# Altium footprint library HedefPro_Library.PcbLib: 35 footprints (part 1 of 3)
Each footprint in its own frame and in the unit in brackets; x right, y up, seen from the top. Pads: shape width x height; smd on the part's side, far side on the other; paste and mask are expansions set on the pad; w line width, h text height; cw(c..) or ccw(c..) is an arc to the next point about the centre after c.
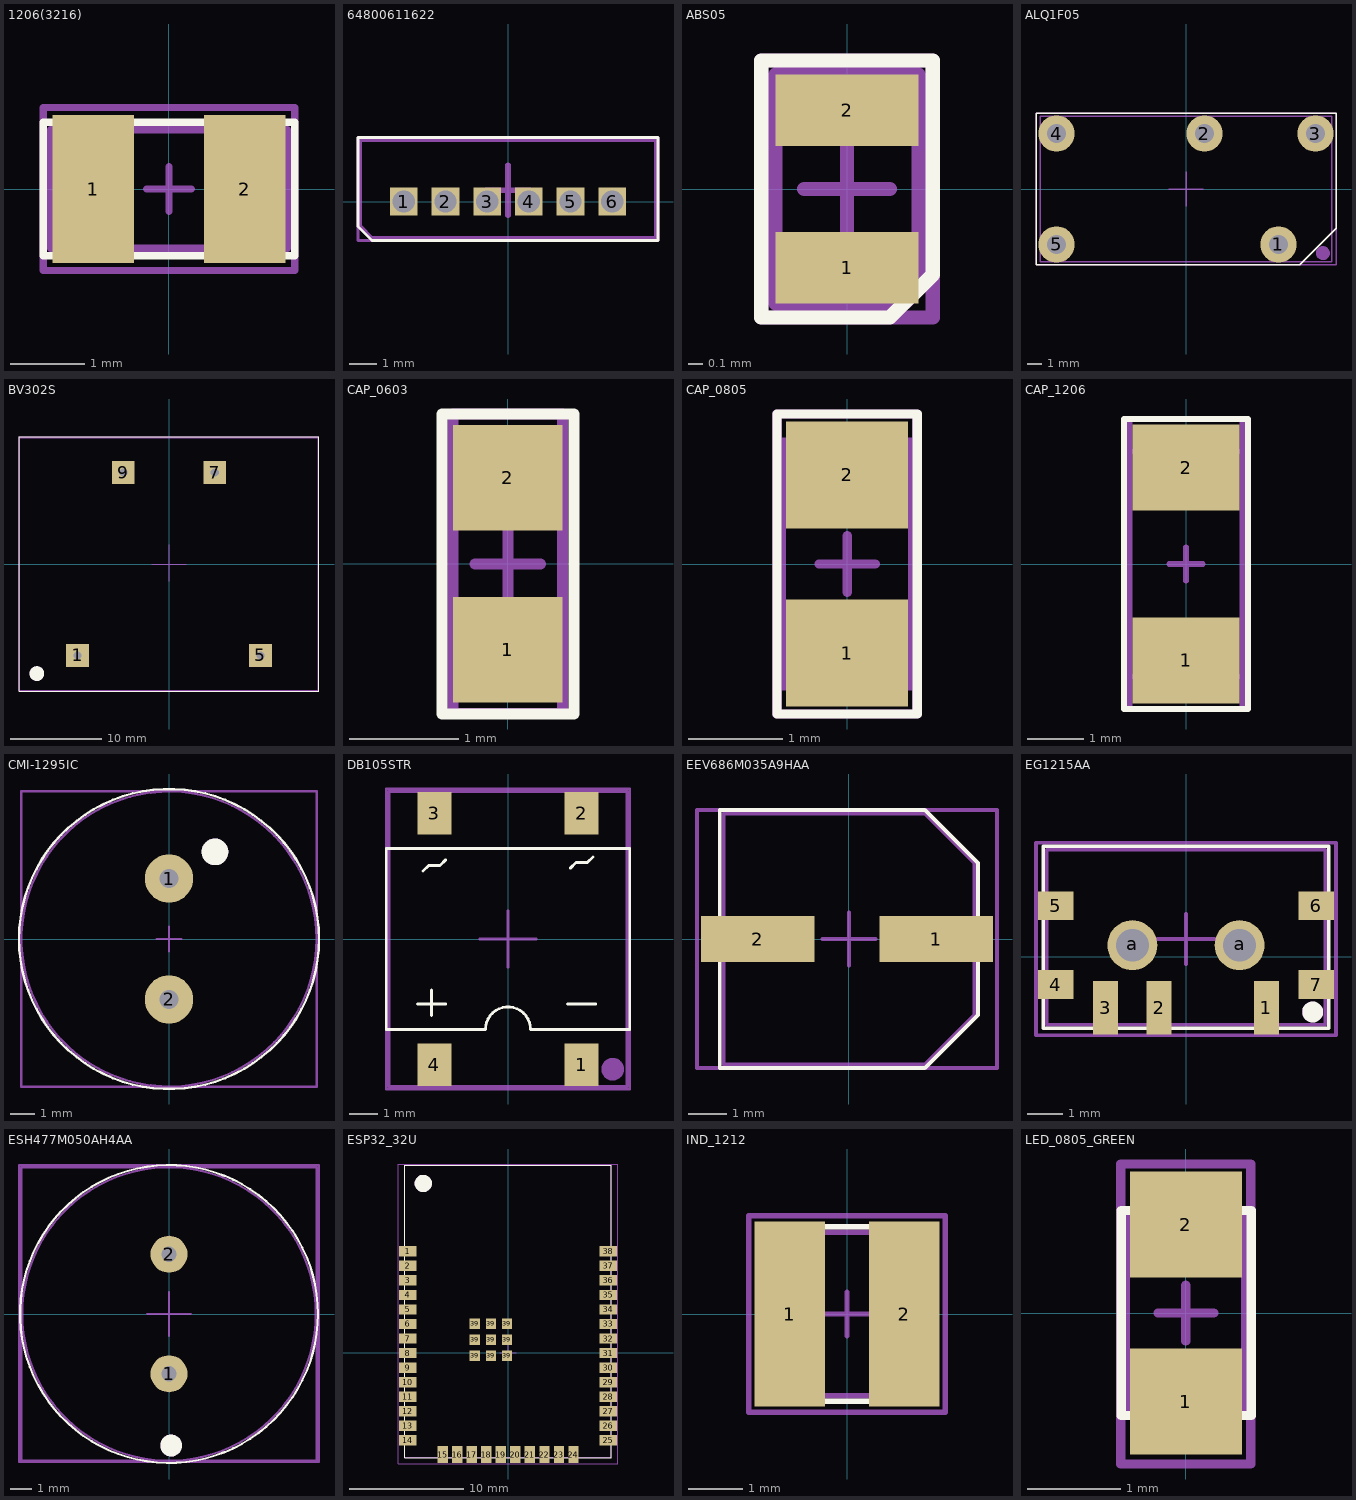
[diagram p0: the footprints below, top view; thin cyan lines are the x and y axes]

## 1206(3216) [mm]
pads (2):
  rect 1.1x2 smd mask+0.05: 1(-1.025,0) 2(1.025,0)
Top Overlay:
  lines w0.1: -1.7,-0.9 1.7,-0.9 1.7,0.9 -1.7,0.9 -1.7,-0.9
Top 3D Body:
  lines w0.1: -1.6,-0.8 -1.6,0.8 1.6,0.8 1.6,-0.8 -1.6,-0.8
Top Component Center:
  lines w0.1: -0.3,0 0.3,0 ; 0,-0.3 0,0.3 ; -1.7,-1.1 -1.7,1.1 1.7,1.1 1.7,-1.1 -1.7,-1.1
Top Designator:
  lines w0.1: -1.7,-1.1 -1.7,1.1 1.7,1.1 1.7,-1.1 -1.7,-1.1
  text ".Designator" at -1,-0.133 h0.5
3D body "1206(3216).x_t": height 0.56, standoff 0, extent -1.55,-0.775 1.55,0.775

## 64800611622 [mm]
pads (6):
  rect 1x1 hole 0.8 mask+0.05: 1(-3.75,0) 2(-2.25,0) 3(-0.75,0) 4(0.75,0) 5(2.25,0) 6(3.75,0)
Top Overlay:
  lines w0.1: -5.4,-0.9 -4.9,-1.4 5.4,-1.4 5.4,2.3 -5.4,2.3 -5.4,-0.9
Top 3D Body:
  lines w0.1: -5.3,-0.893 -4.893,-1.3 5.3,-1.3 5.3,2.2 -5.3,2.2 -5.3,-0.893
Top Component Center:
  lines w0.1: -5.4,-1.4 5.4,-1.4 5.4,2.3 -5.4,2.3 -5.4,-1.4
  lines w0.2: -0.8,0.4 0,0.4 0.8,0.4 ; 0,-0.5 0,1.3 ; 0.8,0.4 0.8,0.4
Top Designator:
  lines w0.1: -5.4,-1.4 5.4,-1.4 5.4,2.3 -5.4,2.3 -5.4,-1.4
  text ".Designator" at -3.846,-0.138 h1.52
3D body "64800611622 (rev1).stp": height 4.75, standoff -2.45, extent -5.25,-1.3 5.25,2.2

## ABS05 [mm]
pads (2):
  rect 1x0.5 smd mask+0.05: 1(0,-0.55) 2(0,0.55)
Top Overlay:
  lines w0.1: -0.6,-0.9 -0.6,0.9 0.6,0.9 0.6,-0.6 0.3,-0.9 -0.6,-0.9
Top 3D Body:
  lines w0.1: -0.5,-0.8 -0.5,0.8 0.5,0.8 0.5,-0.7 0.4,-0.8 -0.5,-0.8
Top Component Center:
  lines w0.1: -0.3,0 0.3,0 ; 0,-0.3 0,0.3 ; -0.6,-0.9 0.6,-0.9 0.6,0.9 -0.6,0.9 -0.6,-0.9
Top Designator:
  lines w0.1: -0.6,-0.9 0.6,-0.9 0.6,0.9 -0.6,0.9 -0.6,-0.9
  text ".Designator" at 0.167,-0.4 h0.4
3D body "ABS05--3DModel-STEP-400430.STEP": height 0.5, standoff 0, extent -0.5,-0.8 0.5,0.8

## ALQ1F05 [mm]
pads (5):
  round 2.5 hole 1.3 mask+0.05: 1(6.35,-3.81) 2(1.27,3.81) 3(8.89,3.81) 4(-8.89,3.81) 5(-8.89,-3.81)
Top Overlay:
  lines w0.1: -10.3,-5.2 7.8,-5.2 10.3,-2.7 10.3,5.2 -10.3,5.2 -10.3,-5.2
Top 3D Body:
  circle w0.5: c9.4,-4.4 r0.23
  lines w0.1: -10,-5 -10,5 ; -10,-5 10,-5 ; -10,-5 -10,5 ; -10,-5 10,-5 ; -10,5 10,5 ; -10,5 10,5 ; 10,-5 10,5 ; 10,-5 10,5
Top Component Center:
  lines w0.1: -1.2,0 1.2,0 ; 0,-1.2 0,1.2 ; -10.3,-5.2 -10.3,5.2 10.3,5.2 10.3,-5.2 -10.3,-5.2
Top Designator:
  lines w0.1: -10.3,-5.2 -10.3,5.2 10.3,5.2 10.3,-5.2 -10.3,-5.2
  text ".Designator" at -4.9,-0.534 h2
3D body: height 0.1, standoff -4.1, extent -9.29,-4.21 -8.49,-3.41
3D body: height 0.1, standoff -4.1, extent -9.29,3.41 -8.49,4.21
3D body: height 0.1, standoff -4.1, extent 0.87,3.41 1.67,4.21
3D body: height 0.1, standoff -4.1, extent 8.49,3.41 9.29,4.21
3D body: height 0.1, standoff -4.1, extent 5.95,-4.21 6.75,-3.41
3D body: height 12.6, standoff 0.1, extent -10,-5 10,5
3D body: height 15.7, standoff 12.6, extent -10,-5 10,5

## BV302S [mm]
pads (4):
  rect 2.5x2.5 hole 0.9 mask+0.05: 1(-10,-10) 5(10,-10) 7(5,10) 9(-5,10)
Top Overlay:
  circle w0.8: c-14.446,-11.977 r0.4
  lines w0.1: -16.4,-13.9 -16.4,13.9 16.4,13.9 16.4,-13.9 -16.4,-13.9
Top 3D Body:
  circle w0.8: c-14.449,-11.981 r0.4
  lines w0.1: -16.3,-13.8 -16.3,13.8 16.3,13.8 16.3,-13.8 -16.3,-13.8
Top Component Center:
  lines w0.1: -1.9,0 1.9,0 ; 0,-1.9 0,2.1 ; -16.4,-13.9 -16.4,13.9 16.4,13.9 16.4,-13.9 -16.4,-13.9
Top Designator:
  lines w0.1: -16.4,-13.9 -16.4,13.9 16.4,13.9 16.4,-13.9 -16.4,-13.9
  text ".Designator" at -7.546,-0.038 h1.52
3D body "BV EI 302 2902.step": height 22.2, standoff -4.1, extent -16.25,-13.75 16.25,13.75

## CAP_0603 [mm]
pads (2):
  rect 1x0.965 smd mask+0.05: 1(0,-0.787) 2(0,0.788)
Top Overlay:
  lines w0.1: -0.602,-1.373 0.605,-1.373 0.605,1.367 -0.602,1.367 -0.602,-1.373
Top 3D Body:
  lines w0.1: -0.5,-1.04 -0.5,1.051 0.5,1.051 0.5,-1.04 -0.5,-1.04
Top Component Center:
  lines w0.1: -0.3,0 0.3,0 ; 0,-0.3 0,0.3 ; -0.5,-1.37 0.5,-1.37 0.5,1.369 -0.5,1.369 -0.5,-1.37
Top Designator:
  lines w0.1: -0.5,-1.37 0.5,-1.37 0.5,1.369 -0.5,1.369 -0.5,-1.37
  text ".Designator" at 0.05,-1.05 h0.3
3D body "CAPC0603.STEP": height 0.85, standoff 0.05, extent -0.507,-1.047 0.522,1.053

## CAP_0805 [mm]
pads (2):
  rect 1.3x1.14 smd mask+0.05: 1(0,-0.95) 2(0,0.95)
Top Overlay:
  lines w0.1: -0.749,-1.6 -0.749,1.6 0.749,1.6 0.749,-1.6 -0.749,-1.6
Top 3D Body:
  lines w0.1: -0.7,-1.3 0.7,-1.3 0.7,1.3 -0.7,1.3 -0.7,-1.3
Top Component Center:
  lines w0.1: -0.3,0 0.3,0 ; 0,-0.3 0,0.3 ; -0.745,-1.6 -0.745,1.6 0.742,1.6 0.742,-1.6 -0.745,-1.6
Top Designator:
  lines w0.1: -0.754,-1.6 0.751,-1.6 0.751,1.6 -0.754,1.6 -0.754,-1.6
  text ".Designator" at 0.134,-0.8 h0.5
3D body "CAPC0805.STEP": height 1, standoff 0.1, extent -0.678,-1.301 0.678,1.301

## CAP_1206 [mm]
pads (2):
  rect 1.9x1.52 smd mask+0.05: 1(0,-1.71) 2(0,1.71)
Top Overlay:
  lines w0.1: -1.1,-2.571 -1.1,2.571 1.1,2.571 1.1,-2.571 -1.1,-2.571
Top 3D Body:
  lines w0.1: -1,-2 -1,2 1,2 1,-2 -1,-2
Top Component Center:
  lines w0.1: -0.3,0 0.3,0 ; 0,-0.3 0,0.3 ; -1,-2.57 -1,2.569 1,2.569 1,-2.57 -1,-2.57
Top Designator:
  lines w0.1: -1,-2.569 -1,2.568 1,2.568 1,-2.569 -1,-2.569
  text ".Designator" at 0.25,-0.65 h0.6
3D body "CAPC1206.STEP": height 1.4, standoff 0.09, extent -0.976,-1.975 0.976,1.975

## CMI-1295IC [mm]
pads (2):
  round 2 hole 0.8 mask+0.05: 1(0,2.5) 2(0,-2.5)
Top Overlay:
  circle w0.6: c1.9,3.6 r0.25
  circle w0.1: c0,0 r6.2
Top 3D Body:
  circle w0.6: c1.9,3.6 r0.25
  lines w0.1: -6.1,-6.1 -6.1,6.1 6.1,6.1 6.1,-6.1 -6.1,-6.1
Top Component Center:
  circle w0.1: c0,0 r6.1
  lines w0.1: -0.5,0 0.5,0 ; 0,-0.5 0,0.5
Top Designator:
  circle w0.1: c0,0 r6.1
  text ".Designator" at -3.346,-0.638 h1.52
3D body: height 9.8, standoff 0.1, extent -6.1,-6.1 6.1,6.1
3D body: height 0.1, standoff -3.9, extent -0.32,-2.82 0.32,-2.18
3D body: height 0.1, standoff -5.4, extent -0.32,2.18 0.32,2.82

## DB105STR [mm]
pads (4):
  rect 1.2x1.5 smd mask+0.05: 1(2.6,-4.45) 2(2.6,4.45) 3(-2.6,4.45) 4(-2.6,-4.45)
Top Overlay:
  lines w0.1: -3.2,-2.3 -2.2,-2.3 ; -3,2.4 -2.8,2.6 -2.4,2.6 -2.2,2.8 ; -2.7,-2.7 -2.7,-1.8 ; 2.1,-2.3 3.1,-2.3 ; 2.2,2.5 2.4,2.7 2.8,2.7 3,2.9 ; -4.3,-3.2 -0.8,-3.2 cw(c0,-3.2) 0.8,-3.2 4.3,-3.2 4.3,3.2 -4.3,3.2 -4.3,-3.2
Top 3D Body:
  circle w0.4: c3.7,-4.6 r0.2
  lines w0.1: -4.2,-5.2 4.2,-5.2 ; -4.2,-5.2 4.2,-5.2 ; -4.2,-5.2 4.2,-5.2 ; -4.2,-5.2 -4.2,5.2 ; -4.2,-5.2 -4.2,5.2 ; -4.2,-5.2 -4.2,5.2 ; -4.2,5.2 4.2,5.2 ; -4.2,5.2 4.2,5.2 ; -4.2,5.2 4.2,5.2 ; 4.2,-5.2 4.2,5.2 ; 4.2,-5.2 4.2,5.2 ; 4.2,-5.2 4.2,5.2
Top Component Center:
  lines w0.1: -1,0 1,0 ; 0,-1 0,1 ; -4.3,-5.3 -4.3,5.3 4.3,5.3 4.3,-5.3 -4.3,-5.3
Top Designator:
  lines w0.1: -4.3,-5.3 -4.3,5.3 4.3,5.3 4.3,-5.3 -4.3,-5.3
  text ".Designator" at -3.1,-0.6 h1.2
3D body "User Library-DB107S  DB-S.step": height 2.76, standoff 0.1, extent -4.16,-5.2 4.16,5.2

## EEV686M035A9HAA [mm]
pads (2):
  rect 3x1.2 smd mask+0.05: 1(2.3,0) 2(-2.4,0)
Top Overlay:
  rectangle: -3.4,-0.6 -2.8,0.6
  lines w0.1: -3.4,-3.4 2,-3.4 3.4,-2 3.4,2 2,3.4 -3.4,3.4 -3.4,-3.4
Top 3D Body:
  rectangle: -3.3,-0.6 -2.7,0.6
  lines w0.1: -3.3,-3.3 2,-3.3 3.3,-2 3.3,2 2,3.3 -3.3,3.3 -3.3,-3.3
Top Component Center:
  lines w0.1: -0.7,0 0.7,0 ; 0,-0.7 0,0.7 ; -4,-3.4 3.9,-3.4 3.9,3.4 -4,3.4 -4,-3.4
Top Designator:
  lines w0.1: -4,-3.4 3.9,-3.4 3.9,3.4 -4,3.4 -4,-3.4
  text ".Designator" at -2.046,-1.138 h1.52
3D body: height 1.2, standoff 0.2, extent -3.3,-3.309 3.3,3.3
3D body: height 0.4, standoff 0.1, extent 0.9,-0.325 3.5,0.325
3D body: height 0.4, standoff 0.1, extent -3.5,-0.325 -0.9,0.325
3D body: height 8.9, standoff 1.2, extent -3.2,-3.2 3.2,3.2

## EG1215AA [mm]
pads (9):
  rect 0.7x1.5 smd mask+0.05: 1(2.25,-1.425) 2(-0.75,-1.425) 3(-2.25,-1.425)
  rect 1x0.8 smd mask+0.05: 4(-3.65,-0.775) 5(-3.65,1.425) 6(3.65,1.425) 7(3.65,-0.775)
  round 1.4 hole 0.92 mask+0.05: a(-1.5,0.325) a(1.5,0.325)
Top Overlay:
  circle w0.3: c3.547,-1.543 r0.141
  lines w0.1: -4,-2 -4,3.1 4,3.1 4,-2 -4,-2
Top 3D Body:
  circle w0.3: c3.542,-1.543 r0.141
  lines w0.1: -3.9,-1.9 -3.9,3 3.9,3 3.9,-1.9 -3.9,-1.9
Top Component Center:
  lines w0.1: -0.8,0.5 0.8,0.5 ; 0,-0.2 0,1.2 ; -4.2,-2.2 -4.2,3.2 4.2,3.2 4.2,-2.2 -4.2,-2.2
Top Designator:
  lines w0.1: -4.2,-2.2 -4.2,3.2 4.2,3.2 4.2,-2.2 -4.2,-2.2
  text ".Designator" at -2.246,-0.038 h1.52
3D body "EG1215AA--3DModel-STEP-1.STEP": height 1.4, standoff -0.3, extent -3.85,-1.875 3.85,3.025

## ESH477M050AH4AA [mm]
pads (2):
  round 1.7 hole 0.7 mask+0.05: 1(0,-2.75) 2(0,2.75)
Top Overlay:
  circle w0.5: c0.1,-6.05 r0.25
  circle w0.1: c0,0 r6.85
Top 3D Body:
  circle w0.5: c0.1,-6.05 r0.25
  lines w0.1: -6.8,-6.75 -6.8,6.75 6.8,6.75 6.8,-6.75 -6.8,-6.75
Top Component Center:
  lines w0.1: -1,0 1,0 ; 0,-1 0,1 ; -6.9,-6.8 6.9,-6.8 6.9,6.848 -6.9,6.848 -6.9,-6.8
Top Designator:
  circle w0.1: c0,0 r6.75
  text ".Designator" at -4.446,-0.438 h1.52
3D body "esh477m050al3aa.stp": height 22.11, standoff -19.9, extent -6.75,-6.75 6.75,6.75

## ESP32_32U [mm]
pads (47):
  rect 1.5x0.9 smd mask+0.05: 1(-8.75,8.877) 2(-8.75,7.607) 3(-8.75,6.337) 4(-8.75,5.067) 5(-8.75,3.797) 6(-8.75,2.527) 7(-8.75,1.257) 8(-8.75,-0.013) 9(-8.75,-1.283) 10(-8.75,-2.553) 11(-8.75,-3.823) 12(-8.75,-5.093) 13(-8.75,-6.363) 14(-8.75,-7.633) 25(8.75,-7.633) 26(8.75,-6.363) 27(8.75,-5.093) 28(8.75,-3.823) 29(8.75,-2.553) 30(8.75,-1.283) 31(8.75,-0.013) 32(8.75,1.257) 33(8.75,2.527) 34(8.75,3.797) 35(8.75,5.067) 36(8.75,6.337) 37(8.75,7.607) 38(8.75,8.877)
  rect 0.9x1.5 smd mask+0.05: 15(-5.71,-8.877) 16(-4.44,-8.877) 17(-3.17,-8.877) 18(-1.9,-8.877) 19(-0.63,-8.877) 20(0.64,-8.877) 21(1.91,-8.877) 22(3.18,-8.877) 23(4.45,-8.877) 24(5.72,-8.877)
  rect 0.9x0.9 smd mask+0.05: 39(-2.893,-0.24) 39(-2.893,1.16) 39(-2.893,2.56) 39(-1.493,-0.24) 39(-1.493,1.16) 39(-1.493,2.56) 39(-0.093,-0.24) 39(-0.093,1.16) 39(-0.093,2.56)
Top Overlay:
  circle w0.9: c-7.4,14.8 r0.3
  lines w0.1: -9,-9.133 -9,16.4 9,16.4 9,-9.133 -9,-9.133
Top 3D Body:
  circle w0.9: c-7.4,14.8 r0.3
  lines w0.1: -9,-9.1 9,-9.1 9,16.4 -9,16.4 -9,-9.1
Top Component Center:
  lines w0.1: -0.7,0 0.7,0 ; 0,-0.7 0,0.7 ; -9.6,-9.7 -9.6,16.5 9.6,16.5 9.6,-9.7 -9.6,-9.7
Top Designator:
  lines w0.1: -9.6,-9.7 9.6,-9.7 9.6,16.5 -9.6,16.5 -9.6,-9.7
  text ".Designator" at -6,0.033 h2.5
3D body "ESP32 v8.stp": height 2.85, standoff 0.1, extent -9,-9.132 9,16.368

## IND_1212 [mm]
pads (2):
  rect 1.3x3.4 smd mask+0.05: 1(-1.05,0) 2(1.05,0)
Top Overlay:
  lines w0.1: -1.6,-1.6 -1.6,1.6 1.6,1.6 1.6,-1.6 -1.6,-1.6
Top 3D Body:
  lines w0.1: -1.5,-1.5 -1.5,1.5 1.5,1.5 1.5,-1.5 -1.5,-1.5
Top Component Center:
  lines w0.1: -0.4,0 0.4,0 ; 0,-0.4 0,0.4 ; -1.8,-1.8 -1.8,1.8 1.8,1.8 1.8,-1.8 -1.8,-1.8
Top Designator:
  lines w0.1: -1.8,-1.8 -1.8,1.8 1.8,1.8 1.8,-1.8 -1.8,-1.8
  text ".Designator" at -0.95,-0.083 h0.5
3D body: height 1.6, standoff 0.1, extent -1.5,-1.5 1.5,1.5
3D body: height 0.1, standoff 0.09, extent 0.3,-1.5 1.5,1.5
3D body: height 0.1, standoff 0.09, extent -1.5,-1.5 -0.3,1.5

## LED_0805_GREEN [mm]
pads (2):
  rect 1.2x1.14 smd mask+0.05: 1(0,-0.95) 2(0,0.95)
Top Overlay:
  lines w0.1: -0.695,-1.1 -0.695,1.1 0.701,1.1 0.701,-1.1 -0.695,-1.1
Top 3D Body:
  lines w0.1: -0.647,-1 -0.647,1 0.642,1 0.642,-1 -0.647,-1
Top Component Center:
  lines w0.1: -0.3,0 0.3,0 ; 0,-0.3 0,0.3 ; -0.698,-1.62 -0.698,1.6 0.698,1.6 0.698,-1.62 -0.698,-1.62
Top Designator:
  lines w0.1: -0.698,-1.62 -0.698,1.6 0.698,1.6 0.698,-1.62 -0.698,-1.62
  text ".Designator" at 0.133,-0.8 h0.5
3D body "0805LED-GREEN.step": height 1.2, standoff 0.09, extent -0.625,-1 0.625,1